# Altium footprint library CPU_STM.PcbLib: 216 footprints (part 3 of 15)
Each footprint in its own frame and in the unit in brackets; x right, y up, seen from the top. Pads: shape width x height; smd on the part's side, far side on the other; paste and mask are expansions set on the pad; w line width, h text height; cw(c..) or ccw(c..) is an arc to the next point about the centre after c.
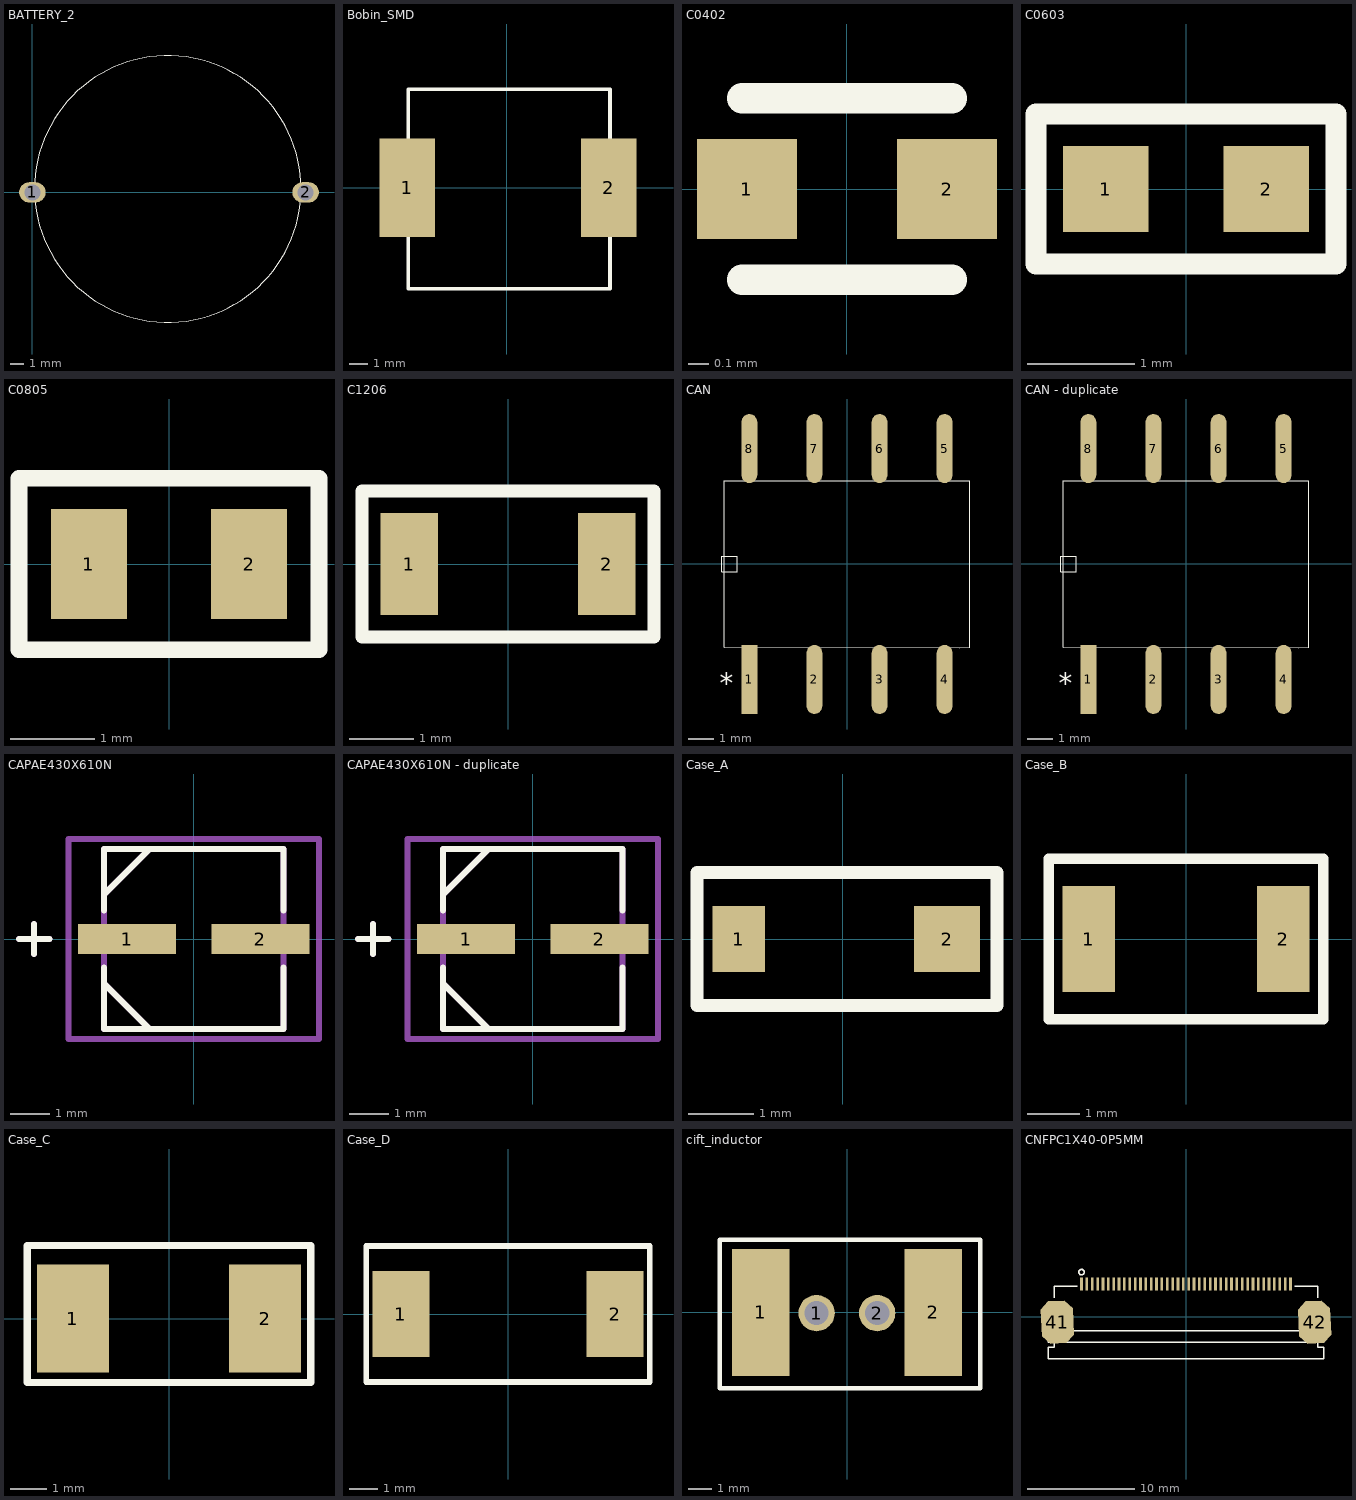
[diagram p2: the footprints below, top view; thin cyan lines are the x and y axes]

## BATTERY_2 [mm]
pads (2):
  oval 2x1.524 hole 1.2: 1(0,0) 2(20.5,0)
Top Overlay:
  circle w0.025: c10.16,0.254 r10
3D body "Battery Holder.step": height 8.7, standoff -3.8, extent -0.9,-11.1 23.6,10.9

## Bobin_SMD [mil]
pads (2):
  rect 118.11x210 smd: 1(-212.5,0) 2(217.5,0)
Top Overlay:
  lines w7.87: -210,-215 -210,-26.57 -210,210 220,210 220,-215 -210,-215
3D body "Coilcraft-MSS1038.step": height 173.23, standoff 15.75, extent -202.75,-205.79 202.76,195.79

## C0402 [mm]
pads (2):
  rect 0.5x0.5 smd: 1(-0.5,0) 2(0.5,0)
Top Overlay:
  lines w0.152: -0.525,-0.453 0.525,-0.453 ; -0.525,0.453 0.525,0.453
3D body "User Library-C0402.step": height 0.57, standoff 0, extent -0.5,-0.26 0.5,0.26

## C0603 [mm]
pads (2):
  rect 0.8x0.8 smd: 1(-0.75,0) 2(0.75,0)
Top Overlay:
  lines w0.2: -1.4,-0.7 -1.4,0.7 1.4,0.7 1.4,-0.7 -1.4,-0.7
3D body "CircuitWorks-C0603.step": height 0.43, standoff -0.43, extent -0.8,-0.405 0.8,0.455

## C0805 [mm]
pads (2):
  rect 0.9x1.3 smd: 1(-0.95,0) 2(0.95,0)
Top Overlay:
  lines w0.2: -1.778,-1.016 1.778,-1.016 1.778,1.016 -1.778,1.016 -1.778,-1.016
3D body "User Library-c0805.step": height 0.95, standoff 0, extent -1,-0.6 1,0.6

## C1206 [mm]
pads (2):
  rect 0.9x1.6 smd: 1(-1.55,0) 2(1.55,0)
Top Overlay:
  lines w0.2: -2.286,-1.143 -2.286,1.143 2.286,1.143 2.286,-1.143 -2.286,-1.143

## CAN [mm] "SO8_W_DUB"
pads (8):
  rect 0.61x2.7 smd: 1(-3.81,-4.515)
  oval 0.61x2.7 smd: 2(-1.27,-4.515) 3(1.27,-4.515) 4(3.81,-4.515) 5(3.81,4.502) 6(1.27,4.502) 7(-1.27,4.502) 8(-3.81,4.502)
Top Overlay:
  lines w0.025: -4.889,-0.311 -4.889,0.298 -4.28,0.298 -4.28,-0.311 -4.889,-0.311 ; -4.788,-3.258 -4.788,3.245 4.788,3.245 4.788,-3.258 4.39,-3.269 -4.788,-3.258
  text "*" at -4.963,-5.036 h0.79

## CAN - duplicate [mm] "SO8_W_DUB"
pads (8):
  rect 0.61x2.7 smd: 1(-3.81,-4.515)
  oval 0.61x2.7 smd: 2(-1.27,-4.515) 3(1.27,-4.515) 4(3.81,-4.515) 5(3.81,4.502) 6(1.27,4.502) 7(-1.27,4.502) 8(-3.81,4.502)
Top Overlay:
  lines w0.025: -4.889,-0.311 -4.28,-0.311 -4.28,0.298 -4.889,0.298 -4.889,-0.311 ; -4.788,-3.258 4.39,-3.269 4.788,-3.258 4.788,3.245 -4.788,3.245 -4.788,-3.258
  text "*" at -4.963,-5.036 h0.79

## CAPAE430X610N [mil]
pads (2):
  rect 97x30 smd: 1(-66,0) 2(66,0)
Top Overlay:
  lines w6: -173,0 -143,0 ; -158,-15 -158,15 ; -89,-28 -89,-44 ; -89,28 -89,89 89,89 89,28 ; -89,44 -44,89 ; -44,-89 -89,-44 ; 89,-28 89,-89 -89,-89 -89,-44
Mechanical 16:
  lines w6: -173,0 -143,0 ; -158,-15 -158,15 ; -89,-44 -44,-89 ; -89,44 -44,89 ; -124,-99 -124,99 124,99 124,-99 -124,-99 ; -89,-89 -89,89 89,89 89,-89 -89,-89

## CAPAE430X610N - duplicate [mil]
pads (2):
  rect 97x30 smd: 1(-66,0) 2(66,0)
Top Overlay:
  lines w6: -173,0 -143,0 ; -158,-15 -158,15 ; -89,-28 -89,-44 ; -89,28 -89,89 89,89 89,28 ; -89,44 -44,89 ; -44,-89 -89,-44 ; 89,-28 89,-89 -89,-89 -89,-44
Mechanical 16:
  lines w6: -173,0 -143,0 ; -158,-15 -158,15 ; -89,-44 -44,-89 ; -89,44 -44,89 ; -124,-99 -124,99 124,99 124,-99 -124,-99 ; -89,-89 -89,89 89,89 89,-89 -89,-89

## Case_A [mm]
pads (2):
  rect 0.8x1 smd: 1(-1.587,0)
  rect 1x1 smd: 2(1.587,0)
Top Overlay:
  lines w0.2: -2.222,-1.016 2.349,-1.016 2.349,1.016 -2.222,1.016 -2.222,-1.016
3D body "Case_A.step": height 1.65, standoff -0.01, extent -1.668,-0.8 1.795,0.8

## Case_B [mm]
pads (2):
  rect 1x2 smd: 1(-1.841,0) 2(1.841,0)
Top Overlay:
  lines w0.2: -2.603,-1.524 -2.603,1.524 2.603,1.524 2.603,-1.524 -2.603,-1.524
3D body "Case_B.STEP": height 2.24, standoff 0.14, extent -1.806,-1.393 1.885,1.427

## Case_C [mm]
pads (2):
  rect 2x3 smd: 1(-2.667,0) 2(2.667,0)
Top Overlay:
  lines w0.2: -3.937,-1.778 -3.937,2.032 3.937,2.032 3.937,-1.778 -3.937,-1.778
3D body "Case_C.STEP": height 2.7, standoff 0, extent -3.05,-1.548 3.05,1.802

## Case_D [mm]
pads (2):
  rect 2x3 smd: 1(-3.739,0) 2(3.739,0)
Top Overlay:
  lines w0.2: -4.953,-2.375 4.953,-2.375 4.953,2.375 -4.953,2.375 -4.953,-2.375
3D body "Case_D.step": height 2.9, standoff 0, extent -3.747,-2.15 4.001,2.15

## cift_inductor [mil]
pads (4):
  rect 95x210 smd: 1(-142.5,0) 2(142.5,0)
  round 60 hole 40: 1(-50.2,-0.98) 2(49.8,-0.98)
Top Overlay:
  lines w7.87: -210,-125 220,-125 220,120 -210,120 -210,-26.57 -210,-125

## CNFPC1X40-0P5MM [mil] "CNFPC1X40-0P5MM"
pads (42):
  rect 9.84x47.24 smd mask+2.36: 1(-383.86,120) 2(-364.17,120) 3(-344.49,120) 4(-324.8,120) 5(-305.12,120) 6(-285.43,120) 7(-265.75,120) 8(-246.06,120) 9(-226.38,120) 10(-206.69,120) 11(-187.01,120) 12(-167.32,120) 13(-147.64,120) 14(-127.95,120) 15(-108.27,120) 16(-88.58,120) 17(-68.9,120) 18(-49.21,120) 19(-29.53,120) 20(-9.84,120) 21(9.84,120) 22(29.53,120) 23(49.21,120) 24(68.9,120) 25(88.58,120) 26(108.27,120) 27(127.95,120) 28(147.64,120) 29(167.32,120) 30(187.01,120) 31(206.69,120) 32(226.38,120) 33(246.06,120) 34(265.75,120) 35(285.43,120) 36(305.12,120) 37(324.8,120) 38(344.49,120) 39(364.17,120) 40(383.86,120)
  oct 118.11x157.48 smd rot 3 mask+2.36: 41(-472.44,-19.68) 42(472.44,-19.68)
Top Overlay:
  circle w5: c-383.86,164.29 r10
  lines w5: -483.27,-43.55 -483.27,-112.29 -506.89,-112.29 -506.89,-153.62 506.89,-153.62 506.89,-112.29 483.27,-112.29 483.27,-43.55 ; -483.27,70.94 -483.27,112.12 -398.78,112.12 ; 398.78,112.12 483.27,112.12 483.27,70.94 ; -506.89,-92.6 506.89,-92.6 506.89,-51.26 -506.89,-51.26 -506.89,-92.6